# Altium footprint library TarabusLib_KOR.PcbLib: 560 footprints (part 7 of 35)
Each footprint in its own frame and in the unit in brackets; x right, y up, seen from the top. Pads: shape width x height; smd on the part's side, far side on the other; paste and mask are expansions set on the pad; w line width, h text height; cw(c..) or ccw(c..) is an arc to the next point about the centre after c.
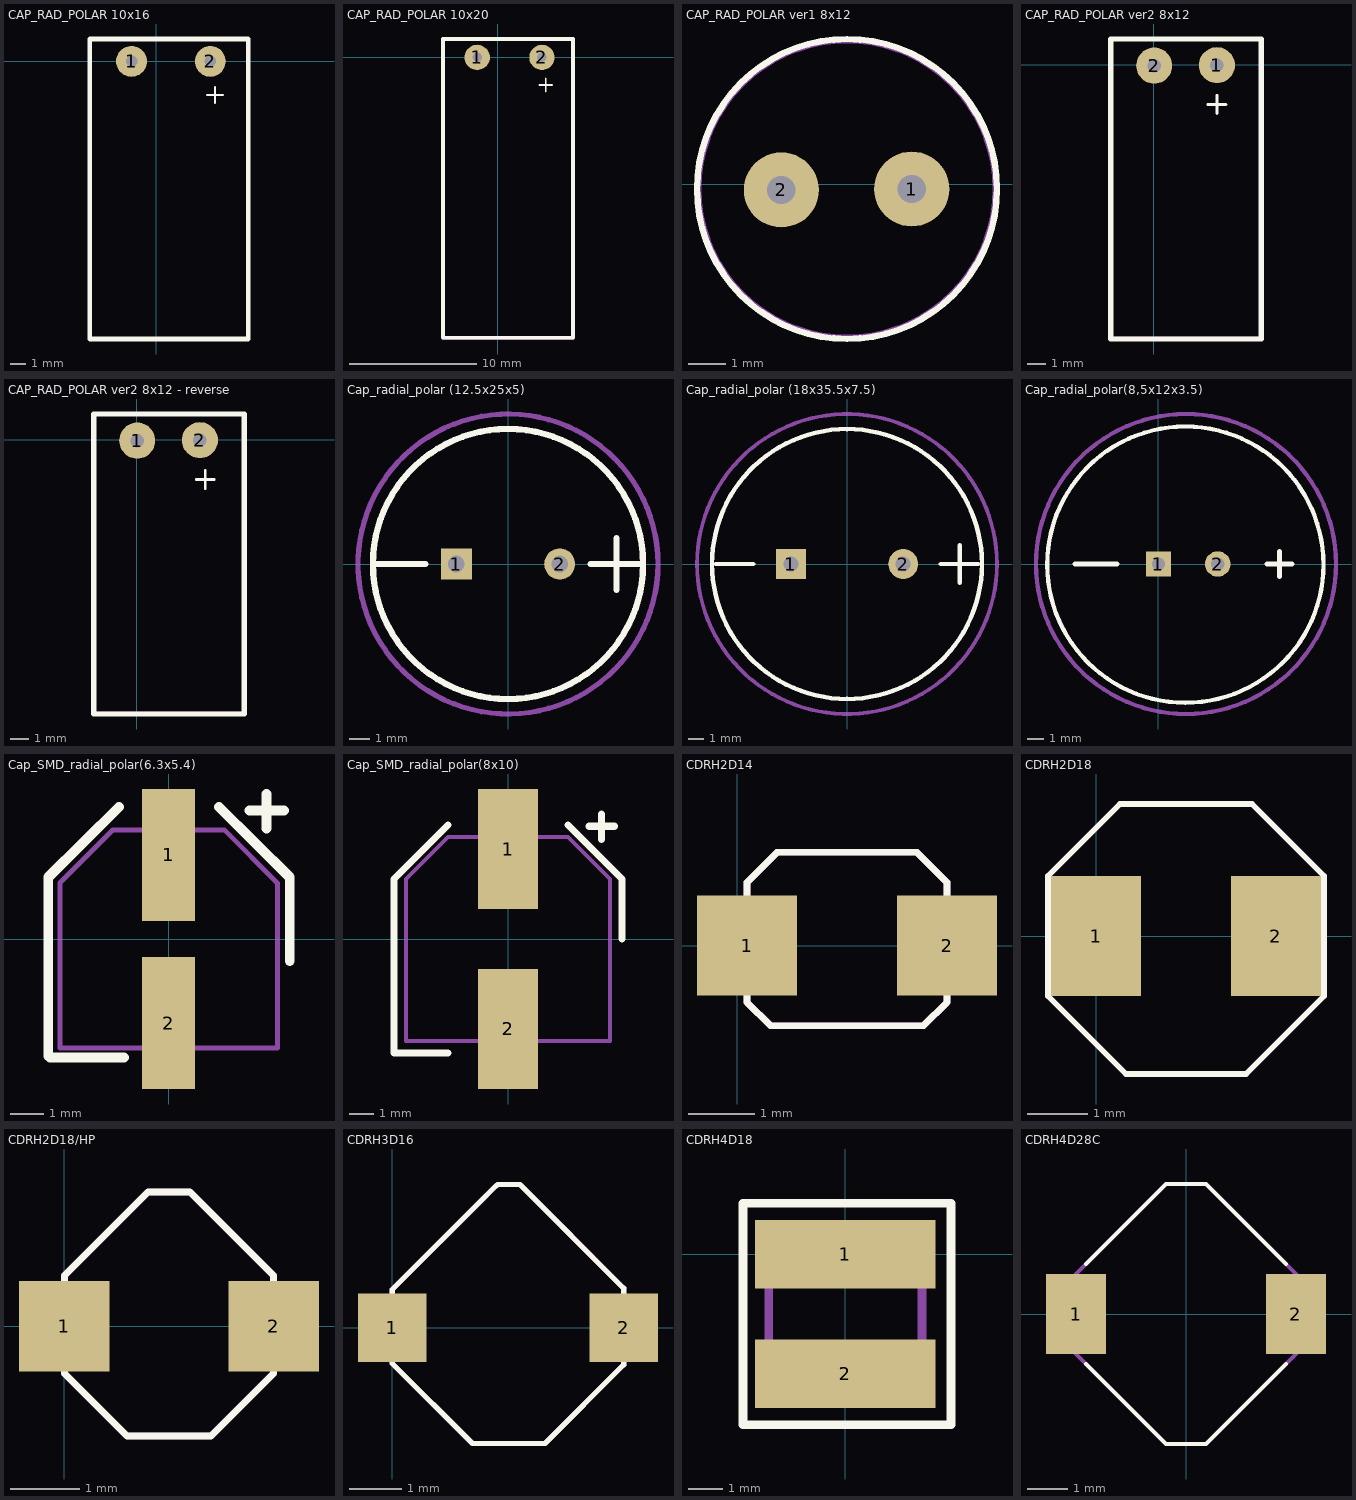
[diagram p6: the footprints below, top view; thin cyan lines are the x and y axes]

## CAP_RAD_POLAR 10x16 [mm] "10x16x5"
height 14.5
pads (2):
  round 2 hole 0.75: 1(-1.6,-0.025) 2(3.5,-0.025)
Top Overlay:
  lines w0.15: 3.3,-2.2 4.3,-2.2 ; 3.8,-2.7 3.8,-1.7
  lines w0.3: -4.3,-18 -4.3,1.425 5.95,1.425 5.95,-18 -4.3,-18
Mechanical 9:
  text ".Designator" at 0.95,-7.375 h0.7
  text ".Comment" at 1.275,-3.275 h0.7
Mechanical 11:
  lines w0.15: -4.3,-18 5.95,-18 5.95,1.425 -4.3,1.425 -4.3,-18
3D body "User Library-Cap electro 10x16x5_0mm RA.step": height 10.03, standoff -3.68, extent -4.1,-17.794 5.951,0.194

## CAP_RAD_POLAR 10x20 [mm] "10x20x5"
height 14.5
pads (2):
  round 2 hole 0.75: 1(-1.6,-0.025) 2(3.5,-0.025)
Top Overlay:
  lines w0.15: 3.3,-2.2 4.3,-2.2 ; 3.8,-2.7 3.8,-1.7
  lines w0.3: -4.3,-22.1 -4.3,1.425 5.95,1.425 5.95,-22.1 -4.3,-22.1
Mechanical 9:
  text ".Designator" at 0.95,-7.375 h0.7
  text ".Comment" at 1.275,-3.275 h0.7
Mechanical 11:
  lines w0.15: -4.3,-22.2 5.95,-22.2 5.95,1.425 -4.3,1.425 -4.3,-22.2
3D body "User Library-Cap electrolitic radial 10x20.STEP": height 10, standoff 0, extent -3.998,-21.9 5.998,-0.4

## CAP_RAD_POLAR ver1 8x12 [mm] "18x8.5x14.5"
height 14.5
pads (2):
  round 2 hole 0.75: 1(9.825,-0.125) 2(6.35,-0.15)
Top Overlay:
  circle w0.17: c8.1,-0.125 r3.996
Mechanical 9:
  text ".Designator" at 6.85,-2.375 h0.7
  text ".Comment" at 7.175,1.725 h0.7
Mechanical 11:
  circle w0.17: c8.1,-0.125 r3.962
3D body "ECAP (К50-35), 220 мкФ, 35 В, 105°C, TK 8X11, TKR221M1VF11, Конденсатор электролитический алюминиевый (исполнение 3).STEP": height 13, standoff -2.5, extent 4.104,-4.1 12.096,3.9

## CAP_RAD_POLAR ver2 8x12 [mm] "8x12x5"
height 14.5
pads (2):
  round 2 hole 0.75: 1(3.5,-0.025) 2(0.025,-0.05)
Top Overlay:
  lines w0.15: 3,-2.2 4,-2.2 ; 3.5,-2.7 3.5,-1.7
  lines w0.3: -2.375,-15.2 -2.375,1.425 5.95,1.425 5.95,-15.2 -2.375,-15.2
Mechanical 9:
  text ".Comment" at 0.475,-4.375 h0.7
  text ".Designator" at 0.15,-8.475 h0.7
Mechanical 11:
  lines w0.15: -2.35,-15.15 5.95,-15.15 5.95,1.425 -2.35,1.425 -2.35,-15.15
3D body "ECAP (К50-35), 220 мкФ, 35 В, 105°C, TK 8X11, TKR221M1VF11, Конденсатор электролитический алюминиевый (исполнение 1).STEP": height 8, standoff -3, extent -2.217,-15.075 5.775,0.225

## CAP_RAD_POLAR ver2 8x12 - reverse [mm] "8x12x5"
height 14.5
pads (2):
  round 2 hole 0.75: 1(0.025,-0.05) 2(3.5,-0.025)
Top Overlay:
  lines w0.15: 3.3,-2.2 4.3,-2.2 ; 3.8,-2.7 3.8,-1.7
  lines w0.3: -2.375,-15.2 5.95,-15.2 5.95,1.425 -2.375,1.425 -2.375,-15.2
Mechanical 9:
  text ".Comment" at 1.275,-3.275 h0.7
  text ".Designator" at 0.95,-7.375 h0.7
Mechanical 11:
  lines w0.15: -2.35,-15.15 -2.35,1.425 5.95,1.425 5.95,-15.15 -2.35,-15.15
3D body "ECAP (К50-35), 220 мкФ, 35 В, 105°C, TK 8X11, TKR221M1VF11, Конденсатор электролитический алюминиевый (исполнение 1).STEP": height 8, standoff -3, extent -2.2,-15.1 5.792,0.2

## Cap_radial_polar (12.5x25x5) [mm] "12.5x25x5"
height 25
pads (2):
  rect 1.5x1.5 hole 0.8: 1(-2.5,0)
  round 1.5 hole 0.8: 2(2.5,0)
Top Overlay:
  circle w0.3: c0,0 r6.53
  lines w0.3: -6.5,0 -4,0 ; 4,0 6.5,0 ; 5.25,-1.25 5.25,1.25
Mechanical 1:
  circle w0.254: c0,0 r7.25

## Cap_radial_polar (18x35.5x7.5) [mm] "18x35.5x7.5"
height 35.5
pads (2):
  rect 2x2 hole 1: 1(-3.75,0)
  round 2 hole 1: 2(3.75,0)
Top Overlay:
  circle w0.3: c0,0 r9
  lines w0.3: -8.75,0 -6.25,0 ; 6.25,0 8.75,0 ; 7.5,-1.25 7.5,1.25
Mechanical 1:
  circle w0.254: c0,0 r10

## Cap_radial_polar(8,5x12x3.5) [mil] "8,5x12x3.5"
height 472.44
pads (2):
  rect 60x60 hole 31.5: 1(0,0)
  round 60 hole 31.5: 2(140,0)
Top Overlay:
  circle w10: c63.43,-1.57 r326.27
  lines w11.81: -196.85,0 -98.43,0 ; 255.91,0 314.96,0 ; 285.43,-29.53 285.43,29.53
Mechanical 1:
  circle w10: c65,0 r354.33

## Cap_SMD_radial_polar(6.3x5.4) [mm] "6.5x5.4"
height 5.4
pads (2):
  rect 1.6x4 smd: 1(0,2.55) 2(0,-2.55)
Top Overlay:
  lines w0.3: -3.65,-3.55 -3.65,-3.05 -3.65,1.85 ; -3.65,1.875 -1.5,4 ; -3.6,-3.6 -1.35,-3.6 ; 1.525,4 3.675,1.875 ; 2.45,3.9 3.5,3.9 ; 2.975,3.35 2.975,4.4 ; 3.675,-0.675 3.675,1.85
Mechanical 7:
  lines w0.15: -3.3,-3.3 3.3,-3.3 3.3,1.7 1.7,3.3 -1.7,3.3 -3.3,1.7 -3.3,-3.3
3D body "User Library-ALU-D.STEP": height 5.4, standoff 0, extent -3.275,-3.5 3.325,3.5

## Cap_SMD_radial_polar(8x10) [mm] "8x10"
height 10
pads (2):
  rect 2.5x5 smd: 1(0,3.75) 2(0,-3.75)
Top Overlay:
  lines w0.3: -2.5,-4.75 -4.75,-4.75 -4.75,-4.25 -4.75,2.5 -2.5,4.75 ; 2.5,4.75 4.75,2.5 4.75,0 ; 3.375,4.7 4.425,4.7 ; 3.9,4.15 3.9,5.2
Mechanical 7:
  lines w0.15: -4.25,-4.25 4.25,-4.25 4.25,2.5 2.5,4.25 -2.5,4.25 -4.25,2.5 -4.25,-4.25
3D body "User Library-ALU-F.STEP": height 10.2, standoff 0, extent -4.15,-4.95 4.15,4.95

## CDRH2D14 [mm]
pads (2):
  rect 1.5x1.5 smd mask+0: 1(0.15,0) 2(3.15,0)
Top Overlay:
  lines w0.1: 0.15,-0.85 0.5,-1.2 2.8,-1.2 3.15,-0.85 3.15,0.95 2.7,1.4 0.6,1.4 0.15,0.95 0.15,-0.85
Mechanical 7:
  lines w0.1: 0.15,-0.85 0.5,-1.2 2.8,-1.2 3.15,-0.85 3.15,0.95 2.7,1.4 0.6,1.4 0.15,0.95 0.15,-0.85

## CDRH2D18 [mm]
pads (2):
  rect 1.5x2 smd mask+0: 1(0,0) 2(3,0)
Top Overlay:
  lines w0.1: -0.8,-1 0.5,-2.3 2.5,-2.3 3.8,-1 3.8,1 2.6,2.2 0.4,2.2 -0.8,1 -0.8,-1
Mechanical 7:
  lines w0.1: -0.8,-1 -0.8,1 0.4,2.2 2.6,2.2 3.8,1 3.8,-1 2.5,-2.3 0.5,-2.3 -0.8,-1
Mechanical 10:
  text ".Designator" at -3.5,3.75 h0.8
  text ".Comment" at 1.5,-3.5 h0.6
3D body "User Library-cdrh2d18.STEP": height 2, standoff 0, extent -0.676,-2.175 3.676,2.176

## CDRH2D18/HP [mm]
height 2
pads (2):
  rect 1.3x1.3 smd: 1(0,0) 2(3,0)
Top Overlay:
  lines w0.1: 0,-0.675 0,0.725 1.2,1.925 1.8,1.925 3,0.725 3,0.65 3,-0.675 2.1,-1.575 0.9,-1.575 0,-0.675
Mechanical 7:
  lines w0.1: 0,-0.675 0.9,-1.575 2.1,-1.575 3,-0.675 3,0.65 3,0.725 1.8,1.925 1.2,1.925 0,0.725 0,-0.675
3D body: height 2, standoff 0, extent 0,-1.575 3,1.925

## CDRH3D16 [mm]
pads (2):
  rect 1.3x1.3 smd: 1(0,0) 2(4.4,0)
Top Overlay:
  lines w0.1: 1.975,2.7 0,0.725 0,-0.675 1.525,-2.2 2.9,-2.2 4.4,-0.7 ; 2,2.725 2.425,2.725 4.4,0.75 4.4,-0.675
Mechanical 7:
  lines w0.1: 1.8,2.525 0,0.725 0,-0.675 1.525,-2.2 2.9,-2.2 4.4,-0.7 ; 3.225,1.925 4.4,0.75 ; 4.4,-0.675 4.4,0.65
3D body: height 2, standoff 0, extent 0,-2.225 4.4,2.725

## CDRH4D18 [mm]
pads (2):
  rect 5.3x2 smd mask+0: 1(0,0) 2(0,-3.5)
Top Overlay:
  lines w0.254: -3,-5 -3,1.5 3.1,1.5 3.1,-5 -3,-5
Mechanical 7:
  lines w0.254: -2.25,-4 2.25,-4 2.25,0.5 -2.25,0.5 -2.25,-4

## CDRH4D28C [mm]
height 3
pads (2):
  rect 1.5x2 smd mask+0: 1(-2.75,0) 2(2.75,0)
Top Overlay:
  lines w0.1: -2.5,-1.25 -0.5,-3.25 0.5,-3.25 2.5,-1.25 ; -2.5,1.25 -0.5,3.25 0.5,3.25 2.5,1.25
Mechanical 7:
  lines w0.1: -3,-0.75 -3,0.75 -0.5,3.25 0,3.25 0.5,3.25 3,0.75 3,0.125 3,-0.125 3,-0.75 0.5,-3.25 -0.5,-3.25 -3,-0.75
Mechanical 10:
  text ".Designator" at -3.5,3.75 h0.8
  text ".Comment" at 1.5,-3.5 h0.6
3D body: height 3, standoff 0, extent -3,-3.25 3,3.25